# Altium footprint library CADTcommon.PcbLib: 503 footprints (part 21 of 32)
Each footprint in its own frame and in the unit in brackets; x right, y up, seen from the top. Pads: shape width x height; smd on the part's side, far side on the other; paste and mask are expansions set on the pad; w line width, h text height; cw(c..) or ccw(c..) is an arc to the next point about the centre after c.
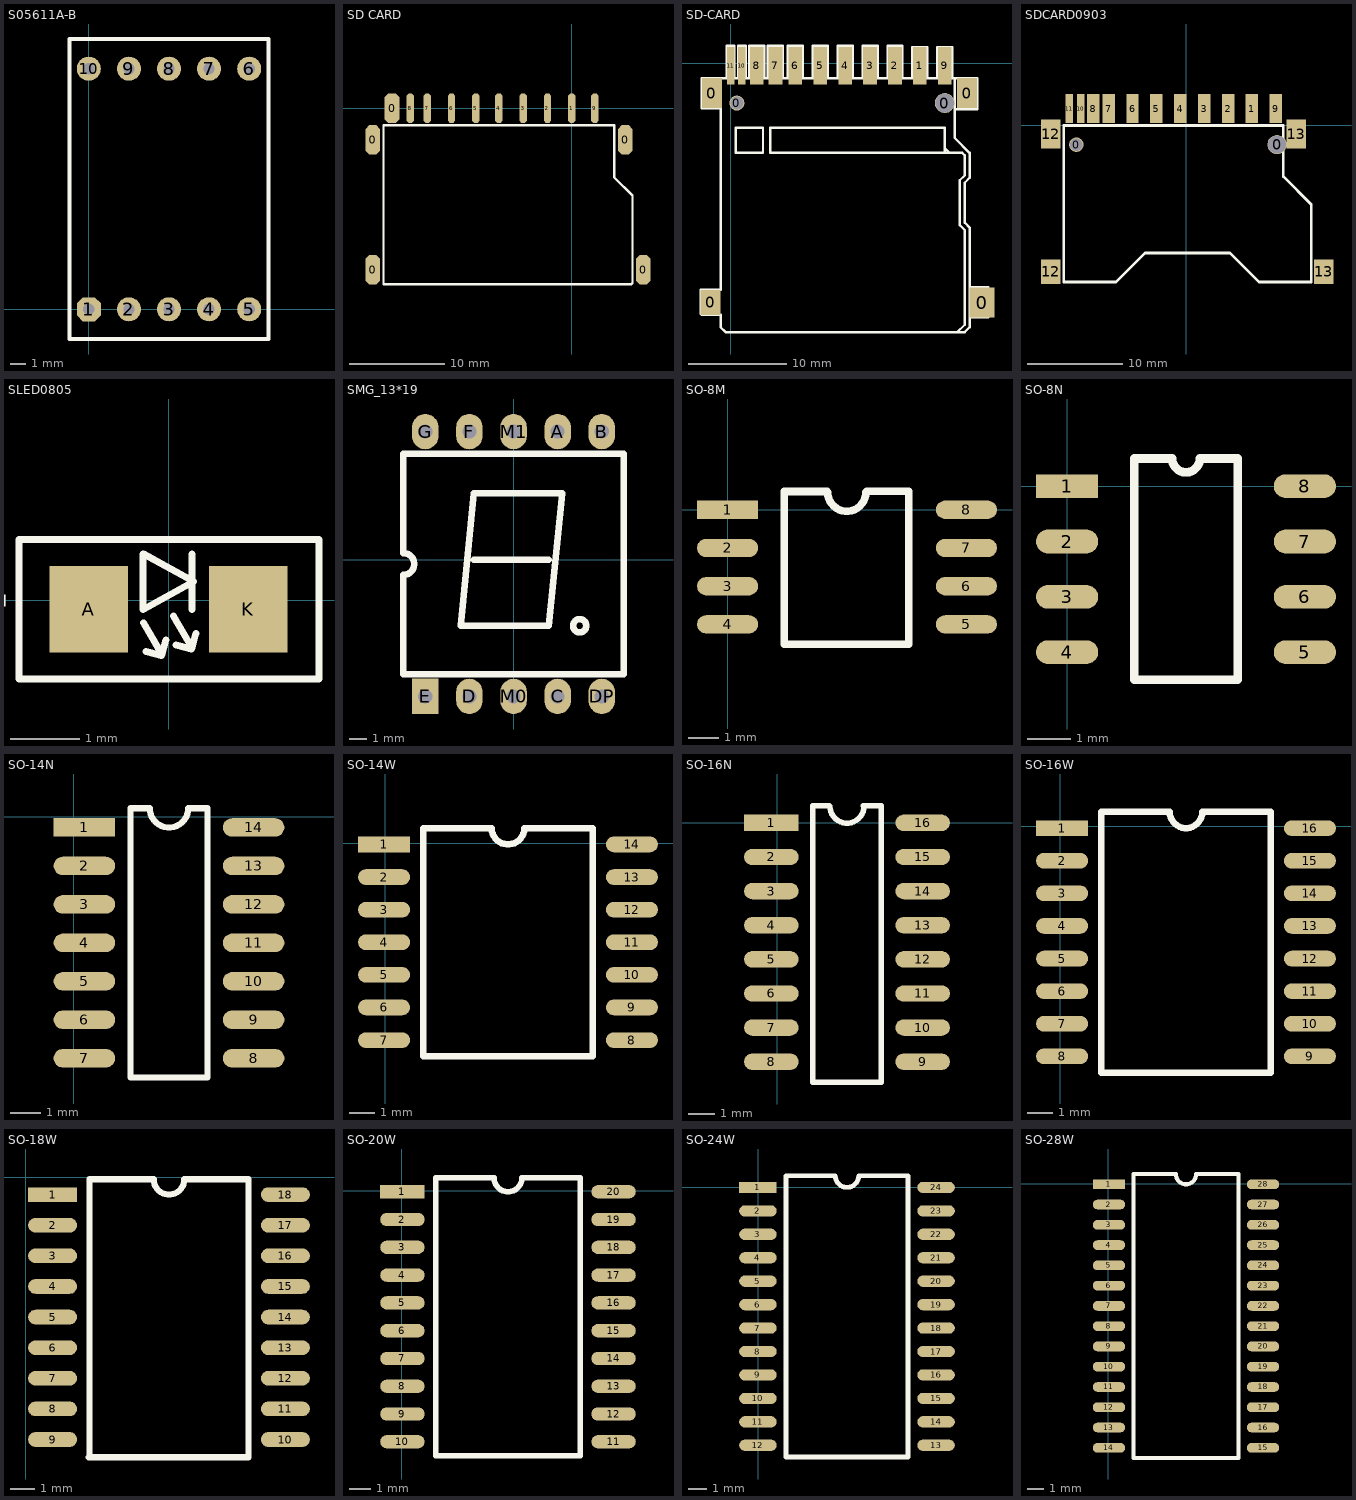
[diagram p20: the footprints below, top view; thin cyan lines are the x and y axes]

## S05611A-B [mil]
pads (10):
  oct 60x60 hole 28: 1(0,0)
  round 60 hole 28: 2(100,0) 3(200,0) 4(300,0) 5(400,0) 6(400,600) 7(300,600) 8(200,600) 9(100,600) 10(0,600)
Top Overlay:
  lines w10: -48.03,-74.02 448.03,-74.02 448.03,674.02 -48.03,674.02 -48.03,-74.02
  text ".56'" at 100,280 h60
3D body: height 316.25, standoff -156.19, extent -50,-75 450,675

## SD CARD [mil]
pads (14):
  oct 60x120 smd: 0(-820,-665) 0(-820,-130) 0(-740,0) 0(220,-130) 0(295,-665)
  oct 30x120 smd: 1(0,0) 2(-100,0) 3(-200,0) 4(-300,0) 5(-395,0) 6(-495,0) 7(-595,0) 8(-665,0) 9(95,0)
Top Overlay:
  lines w10: -775,-725 245,-725 250,-720 250,-360 175,-285 175,-70 -775,-70 -775,-725
3D body: height 118.57, standoff -38.91, extent -848.99,-1369.64 276.99,28

## SD-CARD [mil] "SD插座1"
pads (17):
  rect 80x100 smd: 0(-80,-960)
  rect 80x120 smd: 0(-75,-120) 0(950,-120)
  round 60 hole 52: 0(25,-160)
  round 80 hole 75: 0(860,-160)
  rect 100x120 smd: 0(1009.63,-960.84)
  rect 55x150 smd: 1(760,-10) 2(660,-10) 3(560,-10) 4(460,-10) 5(360,-10) 6(260,-10) 7(180,-10) 8(105,-10) 9(860,-10)
  rect 30x150 smd: 10(45,-10) 11(0,-10)
Top Overlay:
  lines w10: -15,-60 -15,70 15,70 15,-60 -40,-60 -115,-60 -115,-180 -40,-180 -40,-910 -120,-910 -120,-1005 -115,-1010 -40,-1010 -40,-1060 -20,-1080 -10,-1080 940,-1080 960,-1060 960,-660 940,-640 940,-480 960,-460 960,-450 960,-380 960,-360 900,-300 900,-70 900,-60 ; 10,-60 900,-60 ; 30,-60 30,70 60,70 60,-60 ; 75,-55 75,70 135,70 135,-55 ; 110,-360 130,-360 130,-260 20,-260 20,-360 120,-360 ; 150,-55 150,70 210,70 210,-55 ; 230,-55 230,70 290,70 290,-55 ; 330,-55 330,70 390,70 390,-55 ; 430,-55 430,70 490,70 490,-55 ; 530,-55 530,70 590,70 590,-55 ; 630,-55 630,70 690,70 690,-55 ; 730,-60 730,65 790,65 790,-60 ; 830,-60 830,65 890,65 890,-60 ; 860,-340 880,-360 ; 900,-185 990,-185 990,-60 900,-60 ; 910,-1080 940,-1050 940,-680 940,-670 920,-650 920,-470 940,-450 940,-370 930,-360 860,-360 ; 960,-1020 1035,-1020 ; 960,-900 1035,-900 ; 860,-360 860,-350 860,-260 160,-260 160,-360 860,-360

## SDCARD0903 [mm] "SD卡插座0903"
pads (17):
  round 1.524 hole 1.321: 0(-11.5,-2)
  round 2 hole 1.9: 0(9.5,-2)
  rect 1.3x3 smd: 1(6.875,1.778) 2(4.375,1.778) 3(1.875,1.778) 4(-0.625,1.778) 5(-3.125,1.778) 6(-5.625,1.778) 7(-8.125,1.778) 8(-9.75,1.778) 9(9.375,1.778)
  rect 0.762x3 smd: 10(-11.05,1.778) 11(-12.25,1.778)
  rect 2.032x2.54 smd: 12(-14.2,-15.3) 13(14.4,-15.3)
  rect 2.032x3.048 smd: 12(-14.2,-0.9) 13(11.5,-0.9)
Top Overlay:
  lines w0.279: -12.827,-16.383 -12.827,0 10.16,0 10.16,-5.334 13.081,-8.255 13.081,-16.383 7.62,-16.383 4.572,-13.335 0,-13.335 -4.318,-13.335 -7.366,-16.383 -12.827,-16.383

## SLED0805 [mm]
pads (2):
  rect 1.13x1.24 smd: A(-1.143,-0.127) K(1.143,-0.127)
Top Overlay:
  lines w0.1: -0.357,-0.323 -0.094,-0.777 ; -0.321,-0.735 -0.103,-0.793 ; -0.098,-0.79 -0.039,-0.572 ; 0.073,-0.228 0.336,-0.682 ; 0.11,-0.64 0.327,-0.698 ; 0.333,-0.695 0.391,-0.478 ; 0.336,-0.135 0.336,0.665 ; -2.143,-1.127 -2.143,0.873 2.157,0.873 2.157,-1.127 -2.143,-1.127 ; -0.364,-0.135 -0.364,0.665 0.361,0.267 -0.364,-0.135
  text "+" at -2.114,0.642 h1.52

## SMG_13*19 [mil] "GEM5101AE-D"
pads (10):
  oval 60x80 hole 32: A(100,290) B(200,290) C(100,-310) D(-100,-310) DP(200,-310) F(-100,290) G(-200,290) M0(0,-310) M1(0,290)
  rect 60x80 hole 32: E(-200,-310)
Top Overlay:
  circle w15: c150,-150 r15
  lines w15: -90,0 80,0 ; -250,-260 250,-260 250,240 -250,240 -250,15 cw(c-250,-10) -250,-35 -250,-260 ; -120,-150 -90,150 110,150 80,-150 -120,-150

## SO-8M [mil]
pads (8):
  rect 80x24 smd: 1(0,0)
  oval 80x24 smd: 2(0,-50) 3(0,-100) 4(0,-150) 5(312.6,-150) 6(312.6,-100) 7(312.6,-50) 8(312.6,0)
Top Overlay:
  lines w10: 130.06,23.94 74.39,23.94 74.39,-176.06 237.01,-176.06 ; 131,23 ccw(c156,23) 181,23 ; 182,24 237.01,24 ; 236.01,23 237.01,24 ; 237.01,-176 237.01,24

## SO-8N [mm]
pads (8):
  rect 1.44x0.55 smd: 1(0,0)
  oval 1.44x0.55 smd: 2(0,-1.28) 3(0,-2.56) 4(0,-3.84) 5(5.5,-3.84) 6(5.5,-2.56) 7(5.5,-1.28) 8(5.5,0)
Top Overlay:
  lines w0.2: 1.555,-4.48 3.945,-4.48 3.945,0.64 3.07,0.64 cw(c2.75,0.64) 2.43,0.64 1.555,0.64 1.555,-4.48

## SO-14N [mil]
pads (14):
  rect 80x24 smd: 1(14,-14)
  oval 80x24 smd: 2(14,-64) 3(14,-114) 4(14,-164) 5(14,-214) 6(14,-264) 7(14,-314) 8(234,-314) 9(234,-264) 10(234,-214) 11(234,-164) 12(234,-114) 13(234,-64) 14(234,-14)
Top Overlay:
  lines w8: 74,-339 174,-339 174,11 149,11 cw(c124,11) 99,11 74,11 74,-339

## SO-14W [mil]
pads (14):
  rect 80x24 smd: 1(-2,-2)
  oval 80x24 smd: 2(-2,-52) 3(-2,-102) 4(-2,-152) 5(-2,-202) 6(-2,-252) 7(-2,-302) 8(378,-302) 9(378,-252) 10(378,-202) 11(378,-152) 12(378,-102) 13(378,-52) 14(378,-2)
Top Overlay:
  lines w10: 58,-327 58,23 163,23 ccw(c188,23) 213,23 318,23 318,-327 58,-327

## SO-16N [mil]
pads (16):
  rect 80x24 smd: 1(-9,0.1)
  oval 80x24 smd: 2(-9,-49.9) 3(-9,-99.9) 4(-9,-149.9) 5(-9,-199.9) 6(-9,-249.9) 7(-9,-299.9) 8(-9,-349.9) 9(212.9,-349.9) 10(212.9,-299.9) 11(212.9,-249.9) 12(212.9,-199.9) 13(212.9,-149.9) 14(212.9,-99.9) 15(212.9,-49.9) 16(212.9,0.1)
Top Overlay:
  lines w8: 51.9,24.72 51.9,-379.9 151.9,-379.9 151.9,24.72 ; 51.9,25.1 76,25.1 ; 76.9,24.72 ccw(c101.9,24.72) 126.9,24.72 ; 126,25.1 151.9,25.1

## SO-16W [mil]
pads (16):
  rect 80x24 smd: 1(3,-3)
  oval 80x24 smd: 2(3,-53) 3(3,-103) 4(3,-153) 5(3,-203) 6(3,-253) 7(3,-303) 8(3,-353) 9(383,-353) 10(383,-303) 11(383,-253) 12(383,-203) 13(383,-153) 14(383,-103) 15(383,-53) 16(383,-3)
Top Overlay:
  lines w10: 167.72,22 63,22 63,-378 323,-378 323,22 218,22 cw(c193,22) 168,22

## SO-18W [mil]
pads (18):
  rect 80x24 smd: 1(44,-28)
  oval 80x24 smd: 2(44,-78) 3(44,-128) 4(44,-178) 5(44,-228) 6(44,-278) 7(44,-328) 8(44,-378) 9(44,-428) 10(424,-428) 11(424,-378) 12(424,-328) 13(424,-278) 14(424,-228) 15(424,-178) 16(424,-128) 17(424,-78) 18(424,-28)
Top Overlay:
  lines w10: 103,-457 363,-457 ; 104,-457 104,-3 209,-3 ccw(c234,-3) 259,-3 364,-3 364,-457

## SO-20W [mil]
pads (20):
  rect 80x24 smd: 1(1,-2)
  oval 80x24 smd: 2(1,-52) 3(1,-102) 4(1,-152) 5(1,-202) 6(1,-252) 7(1,-302) 8(1,-352) 9(1,-402) 10(1,-452) 11(381,-452) 12(381,-402) 13(381,-352) 14(381,-302) 15(381,-252) 16(381,-202) 17(381,-152) 18(381,-102) 19(381,-52) 20(381,-2)
Top Overlay:
  lines w10: 61,-477 321,-477 321,23 216,23 cw(c191,23) 166,23 61,23 61,-477

## SO-24W [mil]
pads (24):
  rect 80x24 smd: 1(-1,0)
  oval 80x24 smd: 2(-1,-50) 3(-1,-100) 4(-1,-150) 5(-1,-200) 6(-1,-250) 7(-1,-300) 8(-1,-350) 9(-1,-400) 10(-1,-450) 11(-1,-500) 12(-1,-550) 13(379,-550) 14(379,-500) 15(379,-450) 16(379,-400) 17(379,-350) 18(379,-300) 19(379,-250) 20(379,-200) 21(379,-150) 22(379,-100) 23(379,-50) 24(379,0)
Top Overlay:
  lines w10: 59,-575 319,-575 319,25 214,25 cw(c189,25) 164,25 59,25 59,-575

## SO-28W [mil]
pads (28):
  rect 80x24 smd: 1(2,-1)
  oval 80x24 smd: 2(2,-51) 3(2,-101) 4(2,-151) 5(2,-201) 6(2,-251) 7(2,-301) 8(2,-351) 9(2,-401) 10(2,-451) 11(2,-501) 12(2,-551) 13(2,-601) 14(2,-651) 15(382,-651) 16(382,-601) 17(382,-551) 18(382,-501) 19(382,-451) 20(382,-401) 21(382,-351) 22(382,-301) 23(382,-251) 24(382,-201) 25(382,-151) 26(382,-101) 27(382,-51) 28(382,-1)
Top Overlay:
  lines w10: 62,-676 322,-676 322,24 217,24 cw(c192,24) 167,24 62,24 62,-676